# Altium footprint library Molex FFC - FPC Connectors (SMT).PcbLib: 638 footprints (part 1 of 40)
Each footprint in its own frame and in the unit in brackets; x right, y up, seen from the top. Pads: shape width x height; smd on the part's side, far side on the other; paste and mask are expansions set on the pad; w line width, h text height; cw(c..) or ccw(c..) is an arc to the next point about the centre after c.
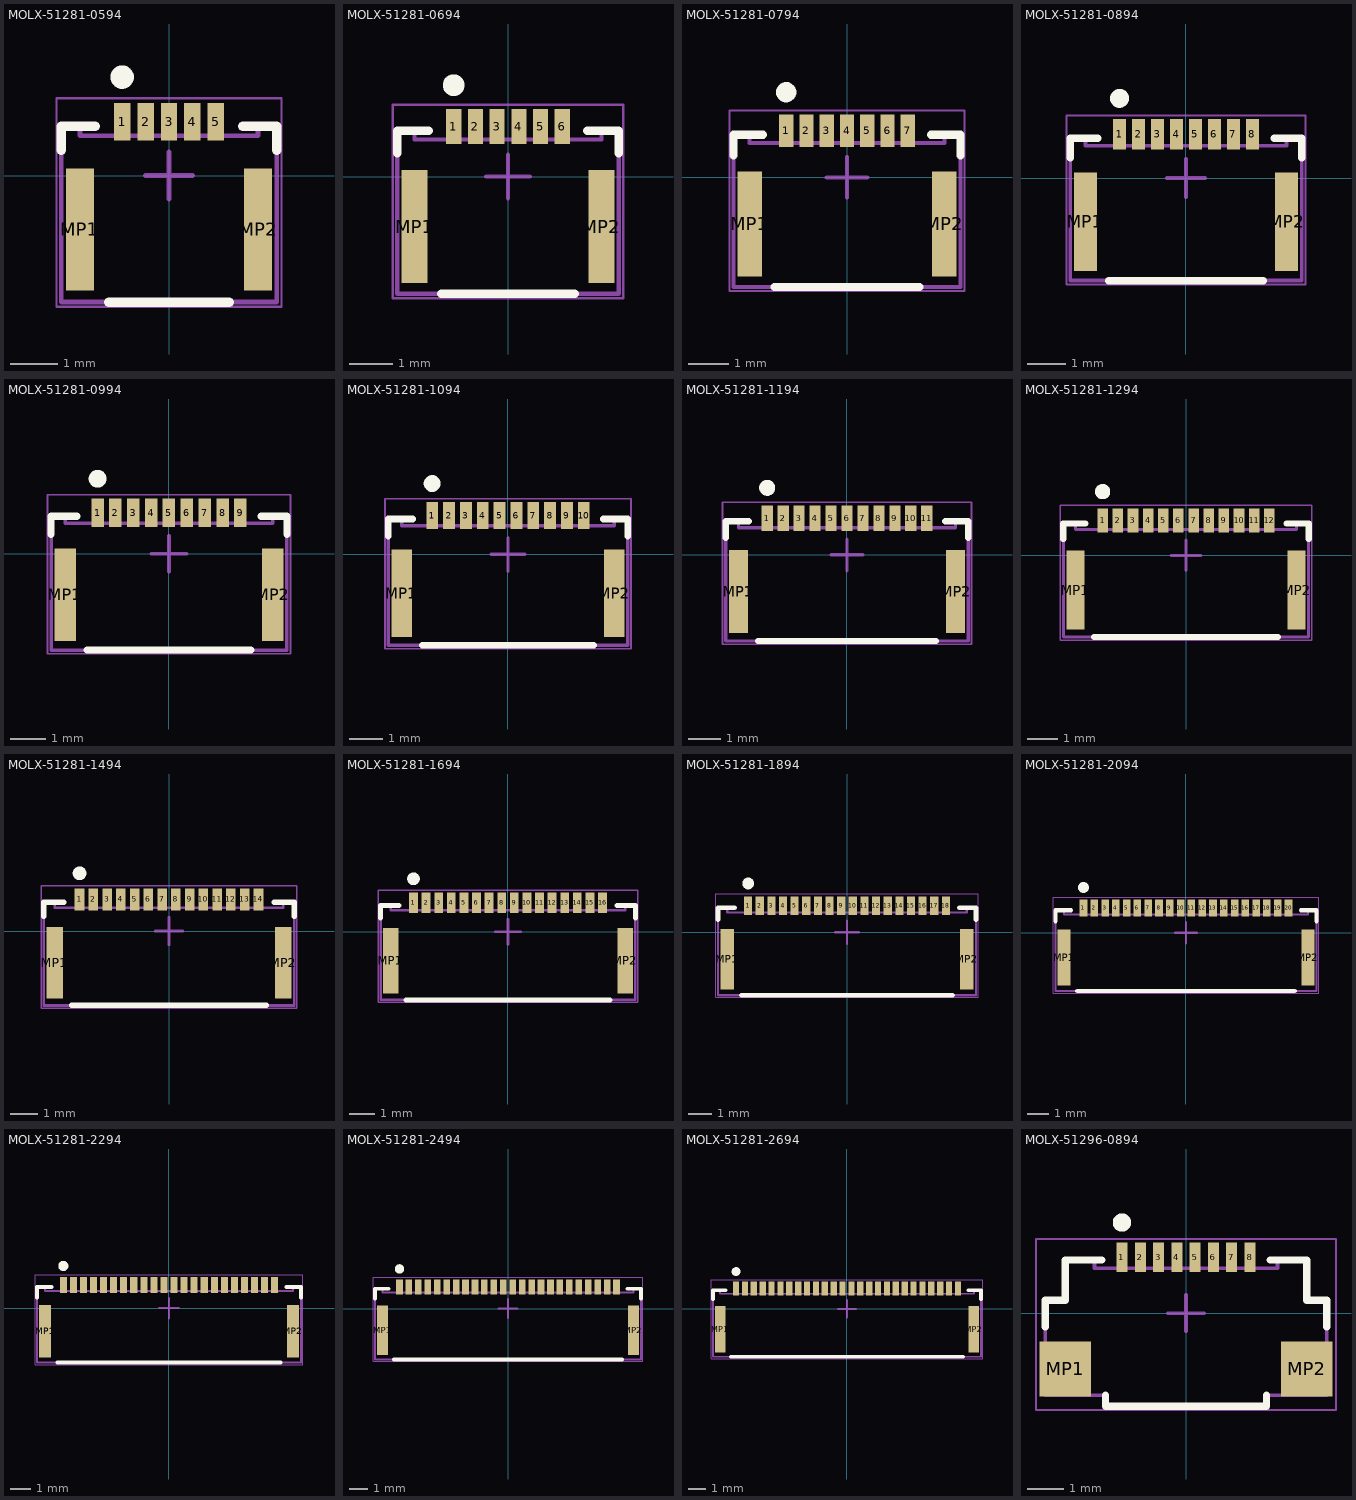
[diagram p0: the footprints below, top view; thin cyan lines are the x and y axes]

## MOLX-51281-0594 [mm] "FPC Connector, 5-Leads, Right Angle, Pitch 0.5 mm, Mated Height 1.2 mm, SMT"
height 1.2
pads (7):
  rect 0.35x0.8 smd paste-0.06: 1(-1,1.15) 2(-0.5,1.15) 3(0,1.15) 4(0.5,1.15) 5(1,1.15)
  rect 0.6x2.6 smd paste-0.06: MP1(-1.9,-1.15) MP2(1.9,-1.15)
Top Overlay:
  circle w0.25: c-1,2.1 r0.125
  lines w0.2: -2.3,0.537 -2.3,1.05 -1.575,1.05 ; -1.288,-2.7 1.288,-2.7 ; 1.575,1.05 2.3,1.05 2.3,0.537
Mechanical 13:
  lines w0.1: -2.3,-2.7 -2.3,1.05 -1.9,1.05 -1.9,0.85 1.9,0.85 1.9,1.05 2.3,1.05 2.3,-2.7 -2.3,-2.7
Mechanical 15:
  lines w0.05: -2.4,-2.8 -2.4,1.65 2.4,1.65 2.4,-2.8 -2.4,-2.8
  lines w0.1: -0.5,0 0.5,0 ; 0,-0.5 0,0.5
3D body: height 0.25, standoff 0, extent -2.3,-2.7 2.3,1.35

## MOLX-51281-0694 [mm] "FPC Connector, 6-Leads, Right Angle, Pitch 0.5 mm, Mated Height 1.2 mm, SMT"
height 1.212
pads (8):
  rect 0.35x0.8 smd paste-0.06: 1(-1.25,1.15) 2(-0.75,1.15) 3(-0.25,1.15) 4(0.25,1.15) 5(0.75,1.15) 6(1.25,1.15)
  rect 0.6x2.6 smd paste-0.06: MP1(-2.15,-1.15) MP2(2.15,-1.15)
Top Overlay:
  circle w0.25: c-1.25,2.1 r0.125
  lines w0.2: -2.55,0.537 -2.55,1.05 -1.825,1.05 ; -1.538,-2.7 1.538,-2.7 ; 1.825,1.05 2.55,1.05 2.55,0.537
Mechanical 13:
  lines w0.1: -2.55,-2.7 -2.55,1.05 -2.15,1.05 -2.15,0.85 2.15,0.85 2.15,1.05 2.55,1.05 2.55,-2.7 -2.55,-2.7
Mechanical 15:
  lines w0.05: -2.65,-2.8 2.65,-2.8 2.65,1.65 -2.65,1.65 -2.65,-2.8
  lines w0.1: -0.5,0 0.5,0 ; 0,-0.5 0,0.5
3D body: height 0.25, standoff 0, extent -2.55,-2.7 2.55,1.35

## MOLX-51281-0794 [mm] "FPC Connector, 7-Leads, Right Angle, Pitch 0.5 mm, Mated Height 1.2 mm, SMT"
height 1.212
pads (9):
  rect 0.35x0.8 smd paste-0.06: 1(-1.5,1.15) 2(-1,1.15) 3(-0.5,1.15) 4(0,1.15) 5(0.5,1.15) 6(1,1.15) 7(1.5,1.15)
  rect 0.6x2.6 smd paste-0.06: MP1(-2.4,-1.15) MP2(2.4,-1.15)
Top Overlay:
  circle w0.25: c-1.5,2.1 r0.125
  lines w0.2: -2.8,0.537 -2.8,1.05 -2.075,1.05 ; -1.788,-2.7 1.788,-2.7 ; 2.075,1.05 2.8,1.05 2.8,0.537
Mechanical 13:
  lines w0.1: -2.8,-2.7 -2.8,1.05 -2.4,1.05 -2.4,0.85 2.4,0.85 2.4,1.05 2.8,1.05 2.8,-2.7 -2.8,-2.7
Mechanical 15:
  lines w0.05: -2.9,-2.8 -2.9,1.65 2.9,1.65 2.9,-2.8 -2.9,-2.8
  lines w0.1: -0.5,0 0.5,0 ; 0,-0.5 0,0.5
3D body: height 0.25, standoff 0, extent -2.8,-2.7 2.8,1.35

## MOLX-51281-0894 [mm] "FPC Connector, 8-Leads, Right Angle, Pitch 0.5 mm, Mated Height 1.2 mm, SMT"
height 1.212
pads (10):
  rect 0.35x0.8 smd paste-0.06: 1(-1.75,1.15) 2(-1.25,1.15) 3(-0.75,1.15) 4(-0.25,1.15) 5(0.25,1.15) 6(0.75,1.15) 7(1.25,1.15) 8(1.75,1.15)
  rect 0.6x2.6 smd paste-0.06: MP1(-2.65,-1.15) MP2(2.65,-1.15)
Top Overlay:
  circle w0.25: c-1.75,2.1 r0.125
  lines w0.2: -3.05,0.537 -3.05,1.05 -2.325,1.05 ; -2.038,-2.7 2.038,-2.7 ; 2.325,1.05 3.05,1.05 3.05,0.537
Mechanical 13:
  lines w0.1: -3.05,-2.7 -3.05,1.05 -2.65,1.05 -2.65,0.85 2.65,0.85 2.65,1.05 3.05,1.05 3.05,-2.7 -3.05,-2.7
Mechanical 15:
  lines w0.05: -3.15,-2.8 3.15,-2.8 3.15,1.65 -3.15,1.65 -3.15,-2.8
  lines w0.1: -0.5,0 0.5,0 ; 0,-0.5 0,0.5
3D body: height 0.25, standoff 0, extent -3.05,-2.7 3.05,1.35

## MOLX-51281-0994 [mm] "FPC Connector, 9-Leads, Right Angle, Pitch 0.5 mm, Mated Height 1.2 mm, SMT"
height 1.212
pads (11):
  rect 0.35x0.8 smd: 1(-2,1.15) 2(-1.5,1.15) 3(-1,1.15) 4(-0.5,1.15) 5(0,1.15) 6(0.5,1.15) 7(1,1.15) 8(1.5,1.15) 9(2,1.15)
  rect 0.6x2.6 smd: MP1(-2.9,-1.15) MP2(2.9,-1.15)
Top Overlay:
  circle w0.25: c-2,2.1 r0.125
  lines w0.2: -3.3,0.537 -3.3,1.05 -2.575,1.05 ; -2.288,-2.7 2.288,-2.7 ; 2.575,1.05 3.3,1.05 3.3,0.537
Mechanical 13:
  lines w0.1: -3.3,-2.7 3.3,-2.7 3.3,1.05 2.9,1.05 2.9,0.85 -2.9,0.85 -2.9,1.05 -3.3,1.05 -3.3,-2.7
Mechanical 15:
  lines w0.05: -3.4,-2.8 3.4,-2.8 3.4,1.65 -3.4,1.65 -3.4,-2.8
  lines w0.1: -0.5,0 0.5,0 ; 0,-0.5 0,0.5
3D body: height 0.25, standoff 0, extent -3.3,-2.7 3.3,1.35

## MOLX-51281-1094 [mm] "FPC Connector, 10-Leads, Right Angle, Pitch 0.5 mm, Mated Height 1.2 mm, SMT"
height 1.212
pads (12):
  rect 0.35x0.8 smd paste-0.06: 1(-2.25,1.15) 2(-1.75,1.15) 3(-1.25,1.15) 4(-0.75,1.15) 5(-0.25,1.15) 6(0.25,1.15) 7(0.75,1.15) 8(1.25,1.15) 9(1.75,1.15) 10(2.25,1.15)
  rect 0.6x2.6 smd paste-0.06: MP1(-3.15,-1.15) MP2(3.15,-1.15)
Top Overlay:
  circle w0.25: c-2.25,2.1 r0.125
  lines w0.2: -3.55,0.537 -3.55,1.05 -2.825,1.05 ; -2.538,-2.7 2.538,-2.7 ; 2.825,1.05 3.55,1.05 3.55,0.537
Mechanical 13:
  lines w0.1: -3.55,-2.7 -3.55,1.05 -3.15,1.05 -3.15,0.85 3.15,0.85 3.15,1.05 3.55,1.05 3.55,-2.7 -3.55,-2.7
Mechanical 15:
  lines w0.05: -3.65,-2.8 3.65,-2.8 3.65,1.65 -3.65,1.65 -3.65,-2.8
  lines w0.1: -0.5,0 0.5,0 ; 0,-0.5 0,0.5
3D body: height 0.25, standoff 0, extent -3.55,-2.7 3.55,1.35

## MOLX-51281-1194 [mm] "FPC Connector, 11-Leads, Right Angle, Pitch 0.5 mm, Mated Height 1.2 mm, SMT"
height 1.212
pads (13):
  rect 0.35x0.8 smd: 1(-2.5,1.15) 2(-2,1.15) 3(-1.5,1.15) 4(-1,1.15) 5(-0.5,1.15) 6(0,1.15) 7(0.5,1.15) 8(1,1.15) 9(1.5,1.15) 10(2,1.15) 11(2.5,1.15)
  rect 0.6x2.6 smd: MP1(-3.4,-1.15) MP2(3.4,-1.15)
Top Overlay:
  circle w0.25: c-2.5,2.1 r0.125
  lines w0.2: -3.8,0.537 -3.8,1.05 -3.075,1.05 ; -2.788,-2.7 2.788,-2.7 ; 3.075,1.05 3.8,1.05 3.8,0.537
Mechanical 13:
  lines w0.1: -3.8,-2.7 3.8,-2.7 3.8,1.05 3.4,1.05 3.4,0.85 -3.4,0.85 -3.4,1.05 -3.8,1.05 -3.8,-2.7
Mechanical 15:
  lines w0.05: -3.9,-2.8 -3.9,1.65 3.9,1.65 3.9,-2.8 -3.9,-2.8
  lines w0.1: -0.5,0 0.5,0 ; 0,-0.5 0,0.5
3D body: height 0.25, standoff 0, extent -3.8,-2.7 3.8,1.35

## MOLX-51281-1294 [mm] "FPC Connector, 12-Leads, Right Angle, Pitch 0.5 mm, Mated Height 1.2 mm, SMT"
height 1.212
pads (14):
  rect 0.35x0.8 smd: 1(-2.75,1.15) 2(-2.25,1.15) 3(-1.75,1.15) 4(-1.25,1.15) 5(-0.75,1.15) 6(-0.25,1.15) 7(0.25,1.15) 8(0.75,1.15) 9(1.25,1.15) 10(1.75,1.15) 11(2.25,1.15) 12(2.75,1.15)
  rect 0.6x2.6 smd: MP1(-3.65,-1.15) MP2(3.65,-1.15)
Top Overlay:
  circle w0.25: c-2.75,2.1 r0.125
  lines w0.2: -4.05,0.537 -4.05,1.05 -3.325,1.05 ; -3.038,-2.7 3.038,-2.7 ; 3.325,1.05 4.05,1.05 4.05,0.537
Mechanical 13:
  lines w0.1: -4.05,-2.7 4.05,-2.7 4.05,1.05 3.65,1.05 3.65,0.85 -3.65,0.85 -3.65,1.05 -4.05,1.05 -4.05,-2.7
Mechanical 15:
  lines w0.05: -4.15,-2.8 -4.15,1.65 4.15,1.65 4.15,-2.8 -4.15,-2.8
  lines w0.1: -0.5,0 0.5,0 ; 0,-0.5 0,0.5
3D body: height 0.25, standoff 0, extent -4.05,-2.699 4.05,1.351

## MOLX-51281-1494 [mm] "FPC Connector, 14-Leads, Right Angle, Pitch 0.5 mm, Mated Height 1.2 mm, SMT"
height 1.212
pads (16):
  rect 0.35x0.8 smd: 1(-3.25,1.15) 2(-2.75,1.15) 3(-2.25,1.15) 4(-1.75,1.15) 5(-1.25,1.15) 6(-0.75,1.15) 7(-0.25,1.15) 8(0.25,1.15) 9(0.75,1.15) 10(1.25,1.15) 11(1.75,1.15) 12(2.25,1.15) 13(2.75,1.15) 14(3.25,1.15)
  rect 0.6x2.6 smd: MP1(-4.15,-1.15) MP2(4.15,-1.15)
Top Overlay:
  circle w0.25: c-3.25,2.1 r0.125
  lines w0.2: -4.55,0.537 -4.55,1.05 -3.825,1.05 ; -3.538,-2.7 3.538,-2.7 ; 3.825,1.05 4.55,1.05 4.55,0.537
Mechanical 13:
  lines w0.1: -4.55,-2.7 -4.55,1.05 -4.15,1.05 -4.15,0.85 4.15,0.85 4.15,1.05 4.55,1.05 4.55,-2.7 -4.55,-2.7
Mechanical 15:
  lines w0.05: -4.65,-2.8 4.65,-2.8 4.65,1.65 -4.65,1.65 -4.65,-2.8
  lines w0.1: -0.5,0 0.5,0 ; 0,-0.5 0,0.5
3D body: height 0.25, standoff 0, extent -4.55,-2.699 4.55,1.351

## MOLX-51281-1694 [mm] "FPC Connector, 16-Leads, Right Angle, Pitch 0.5 mm, Mated Height 1.2 mm, SMT"
height 1.212
pads (18):
  rect 0.35x0.8 smd: 1(-3.75,1.15) 2(-3.25,1.15) 3(-2.75,1.15) 4(-2.25,1.15) 5(-1.75,1.15) 6(-1.25,1.15) 7(-0.75,1.15) 8(-0.25,1.15) 9(0.25,1.15) 10(0.75,1.15) 11(1.25,1.15) 12(1.75,1.15) 13(2.25,1.15) 14(2.75,1.15) 15(3.25,1.15) 16(3.75,1.15)
  rect 0.6x2.6 smd: MP1(-4.65,-1.15) MP2(4.65,-1.15)
Top Overlay:
  circle w0.25: c-3.75,2.1 r0.125
  lines w0.2: -5.05,0.537 -5.05,1.05 -4.325,1.05 ; -4.038,-2.7 4.038,-2.7 ; 4.325,1.05 5.05,1.05 5.05,0.537
Mechanical 13:
  lines w0.1: -5.05,-2.7 5.05,-2.7 5.05,1.05 4.65,1.05 4.65,0.85 -4.65,0.85 -4.65,1.05 -5.05,1.05 -5.05,-2.7
Mechanical 15:
  lines w0.05: -5.15,-2.8 -5.15,1.65 5.15,1.65 5.15,-2.8 -5.15,-2.8
  lines w0.1: -0.5,0 0.5,0 ; 0,-0.5 0,0.5
3D body: height 0.25, standoff 0, extent -5.05,-2.7 5.05,1.35

## MOLX-51281-1894 [mm] "FPC Connector, 18-Leads, Right Angle, Pitch 0.5 mm, Mated Height 1.2 mm, SMT"
height 1.212
pads (20):
  rect 0.35x0.8 smd: 1(-4.25,1.15) 2(-3.75,1.15) 3(-3.25,1.15) 4(-2.75,1.15) 5(-2.25,1.15) 6(-1.75,1.15) 7(-1.25,1.15) 8(-0.75,1.15) 9(-0.25,1.15) 10(0.25,1.15) 11(0.75,1.15) 12(1.25,1.15) 13(1.75,1.15) 14(2.25,1.15) 15(2.75,1.15) 16(3.25,1.15) 17(3.75,1.15) 18(4.25,1.15)
  rect 0.6x2.6 smd: MP1(-5.15,-1.15) MP2(5.15,-1.15)
Top Overlay:
  circle w0.25: c-4.25,2.1 r0.125
  lines w0.2: -5.55,0.537 -5.55,1.05 -4.825,1.05 ; -4.538,-2.7 4.538,-2.7 ; 4.825,1.05 5.55,1.05 5.55,0.537
Mechanical 13:
  lines w0.1: -5.55,-2.7 -5.55,1.05 -5.15,1.05 -5.15,0.85 5.15,0.85 5.15,1.05 5.55,1.05 5.55,-2.7 -5.55,-2.7
Mechanical 15:
  lines w0.05: -5.65,-2.8 5.65,-2.8 5.65,1.65 -5.65,1.65 -5.65,-2.8
  lines w0.1: -0.5,0 0.5,0 ; 0,-0.5 0,0.5
3D body: height 0.25, standoff 0, extent -5.55,-2.7 5.55,1.35

## MOLX-51281-2094 [mm] "FPC Connector, 20-Leads, Right Angle, Pitch 0.5 mm, Mated Height 1.2 mm, SMT"
height 1.212
pads (22):
  rect 0.35x0.8 smd: 1(-4.75,1.15) 2(-4.25,1.15) 3(-3.75,1.15) 4(-3.25,1.15) 5(-2.75,1.15) 6(-2.25,1.15) 7(-1.75,1.15) 8(-1.25,1.15) 9(-0.75,1.15) 10(-0.25,1.15) 11(0.25,1.15) 12(0.75,1.15) 13(1.25,1.15) 14(1.75,1.15) 15(2.25,1.15) 16(2.75,1.15) 17(3.25,1.15) 18(3.75,1.15) 19(4.25,1.15) 20(4.75,1.15)
  rect 0.6x2.6 smd: MP1(-5.65,-1.15) MP2(5.65,-1.15)
Top Overlay:
  circle w0.25: c-4.75,2.1 r0.125
  lines w0.2: -6.05,0.537 -6.05,1.05 -5.325,1.05 ; -5.038,-2.7 5.038,-2.7 ; 5.325,1.05 6.05,1.05 6.05,0.537
Mechanical 13:
  lines w0.1: -6.05,-2.7 6.05,-2.7 6.05,1.05 5.65,1.05 5.65,0.85 -5.65,0.85 -5.65,1.05 -6.05,1.05 -6.05,-2.7
Mechanical 15:
  lines w0.05: -6.15,-2.8 -6.15,1.65 6.15,1.65 6.15,-2.8 -6.15,-2.8
  lines w0.1: -0.5,0 0.5,0 ; 0,-0.5 0,0.5
3D body: height 0.25, standoff 0, extent -6.05,-2.699 6.05,1.351

## MOLX-51281-2294 [mm] "FPC Connector, 22-Leads, Right Angle, Pitch 0.5 mm, Mated Height 1.2 mm, SMT"
height 1.212
pads (24):
  rect 0.35x0.8 smd: 1(-5.25,1.15) 2(-4.75,1.15) 3(-4.25,1.15) 4(-3.75,1.15) 5(-3.25,1.15) 6(-2.75,1.15) 7(-2.25,1.15) 8(-1.75,1.15) 9(-1.25,1.15) 10(-0.75,1.15) 11(-0.25,1.15) 12(0.25,1.15) 13(0.75,1.15) 14(1.25,1.15) 15(1.75,1.15) 16(2.25,1.15) 17(2.75,1.15) 18(3.25,1.15) 19(3.75,1.15) 20(4.25,1.15) 21(4.75,1.15) 22(5.25,1.15)
  rect 0.6x2.6 smd: MP1(-6.15,-1.15) MP2(6.15,-1.15)
Top Overlay:
  circle w0.25: c-5.25,2.1 r0.125
  lines w0.2: -6.55,0.537 -6.55,1.05 -5.825,1.05 ; -5.538,-2.7 5.538,-2.7 ; 5.825,1.05 6.55,1.05 6.55,0.537
Mechanical 13:
  lines w0.1: -6.55,-2.7 6.55,-2.7 6.55,1.05 6.15,1.05 6.15,0.85 -6.15,0.85 -6.15,1.05 -6.55,1.05 -6.55,-2.7
Mechanical 15:
  lines w0.05: -6.65,-2.8 -6.65,1.65 6.65,1.65 6.65,-2.8 -6.65,-2.8
  lines w0.1: -0.5,0 0.5,0 ; 0,-0.5 0,0.5
3D body: height 0.25, standoff 0, extent -6.55,-2.699 6.55,1.351

## MOLX-51281-2494 [mm] "FPC Connector, 24-Leads, Right Angle, Pitch 0.5 mm, Mated Height 1.2 mm, SMT"
height 1.212
pads (26):
  rect 0.35x0.8 smd: 1(-5.75,1.15) 2(-5.25,1.15) 3(-4.75,1.15) 4(-4.25,1.15) 5(-3.75,1.15) 6(-3.25,1.15) 7(-2.75,1.15) 8(-2.25,1.15) 9(-1.75,1.15) 10(-1.25,1.15) 11(-0.75,1.15) 12(-0.25,1.15) 13(0.25,1.15) 14(0.75,1.15) 15(1.25,1.15) 16(1.75,1.15) 17(2.25,1.15) 18(2.75,1.15) 19(3.25,1.15) 20(3.75,1.15) 21(4.25,1.15) 22(4.75,1.15) 23(5.25,1.15) 24(5.75,1.15)
  rect 0.6x2.6 smd: MP1(-6.65,-1.15) MP2(6.65,-1.15)
Top Overlay:
  circle w0.25: c-5.75,2.1 r0.125
  lines w0.2: -7.05,0.537 -7.05,1.05 -6.325,1.05 ; -6.038,-2.7 6.038,-2.7 ; 6.325,1.05 7.05,1.05 7.05,0.537
Mechanical 13:
  lines w0.1: -7.05,-2.7 7.05,-2.7 7.05,1.05 6.65,1.05 6.65,0.85 -6.65,0.85 -6.65,1.05 -7.05,1.05 -7.05,-2.7
Mechanical 15:
  lines w0.05: -7.15,-2.8 -7.15,1.65 7.15,1.65 7.15,-2.8 -7.15,-2.8
  lines w0.1: -0.5,0 0.5,0 ; 0,-0.5 0,0.5
3D body: height 0.25, standoff 0, extent -7.05,-2.7 7.05,1.35

## MOLX-51281-2694 [mm] "FPC Connector, 26-Leads, Right Angle, Pitch 0.5 mm, Mated Height 1.2 mm, SMT"
height 1.212
pads (28):
  rect 0.35x0.8 smd: 1(-6.25,1.15) 2(-5.75,1.15) 3(-5.25,1.15) 4(-4.75,1.15) 5(-4.25,1.15) 6(-3.75,1.15) 7(-3.25,1.15) 8(-2.75,1.15) 9(-2.25,1.15) 10(-1.75,1.15) 11(-1.25,1.15) 12(-0.75,1.15) 13(-0.25,1.15) 14(0.25,1.15) 15(0.75,1.15) 16(1.25,1.15) 17(1.75,1.15) 18(2.25,1.15) 19(2.75,1.15) 20(3.25,1.15) 21(3.75,1.15) 22(4.25,1.15) 23(4.75,1.15) 24(5.25,1.15) 25(5.75,1.15) 26(6.25,1.15)
  rect 0.6x2.6 smd: MP1(-7.15,-1.15) MP2(7.15,-1.15)
Top Overlay:
  circle w0.25: c-6.25,2.1 r0.125
  lines w0.2: -7.55,0.537 -7.55,1.05 -6.825,1.05 ; -6.538,-2.7 6.538,-2.7 ; 6.825,1.05 7.55,1.05 7.55,0.537
Mechanical 13:
  lines w0.1: -7.55,-2.7 -7.55,1.05 -7.15,1.05 -7.15,0.85 7.15,0.85 7.15,1.05 7.55,1.05 7.55,-2.7 -7.55,-2.7
Mechanical 15:
  lines w0.05: -7.65,-2.8 7.65,-2.8 7.65,1.65 -7.65,1.65 -7.65,-2.8
  lines w0.1: -0.5,0 0.5,0 ; 0,-0.5 0,0.5
3D body: height 0.25, standoff 0, extent -7.55,-2.7 7.55,1.35

## MOLX-51296-0894 [mm] "FPC Connector, 8-Leads, Right Angle, Pitch 0.5 mm, Mated Height 1.3 mm, SMT"
height 1.312
pads (10):
  rect 0.3x0.8 smd: 1(-1.75,1.525) 2(-1.25,1.525) 3(-0.75,1.525) 4(-0.25,1.525) 5(0.25,1.525) 6(0.75,1.525) 7(1.25,1.525) 8(1.75,1.525)
  rect 1.4x1.5 smd: MP1(-3.3,-1.525) MP2(3.3,-1.525)
Top Overlay:
  circle w0.25: c-1.75,2.475 r0.125
  lines w0.2: -3.85,-0.375 -3.85,0.35 -3.3,0.35 -3.3,1.45 -2.3,1.45 ; -2.2,-2.25 -2.2,-2.55 2.2,-2.55 2.2,-2.25 ; 2.3,1.45 3.3,1.45 3.3,0.35 3.85,0.35 3.85,-0.375
Mechanical 13:
  lines w0.1: -3.85,-2.25 -3.85,0.35 -3.3,0.35 -3.3,1.45 -2.5,1.45 -2.5,1.225 2.5,1.225 2.5,1.45 3.3,1.45 3.3,0.35 3.85,0.35 3.85,-2.25 2.15,-2.25 2.15,-2.55 -2.15,-2.55 -2.15,-2.25 -3.85,-2.25
Mechanical 15:
  lines w0.05: -4.1,-2.65 -4.1,2.025 4.1,2.025 4.1,-2.65 -4.1,-2.65
  lines w0.1: -0.5,0 0.5,0 ; 0,-0.5 0,0.5
3D body: height 0.25, standoff 0, extent -3.85,-2.549 3.85,1.75